# Altium footprint library chicken.PcbLib: 19 footprints (part 2 of 2)
Each footprint in its own frame and in the unit in brackets; x right, y up, seen from the top. Pads: shape width x height; smd on the part's side, far side on the other; paste and mask are expansions set on the pad; w line width, h text height; cw(c..) or ccw(c..) is an arc to the next point about the centre after c.
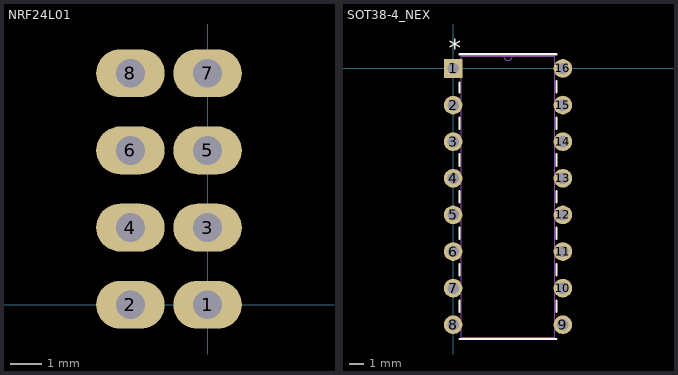
[diagram p1: the footprints below, top view; thin cyan lines are the x and y axes]

## NRF24L01 [mil]
pads (8):
  oval 86x60 hole 36: 1(0,0) 2(-96.85,0) 3(0,96.85) 4(-96.85,96.85) 5(0,193.7) 6(-96.85,193.7) 7(0,290.55) 8(-96.85,290.55)
3D body "NRF24l01_with_antenna.STEP": height 3757.81, standoff -127.56, extent -2823.39,-155 90,445.4

## PCBComponent_1 [mil]

## SOT38-4_NEX [mil]
pads (16):
  rect 51x51 hole 31 mask+0: 1(0,0)
  round 51 hole 31 mask+0: 2(0,-100) 3(0,-200) 4(0,-300) 5(0,-400) 6(0,-500) 7(0,-600) 8(0,-700) 9(300,-700) 10(300,-600) 11(300,-500) 12(300,-400) 13(300,-300) 14(300,-200) 15(300,-100) 16(300,0)
Top Overlay:
  lines w6: 17.5,-739 282.5,-739 ; 17.5,-665.59 17.5,-634.41 ; 17.5,-565.59 17.5,-534.41 ; 17.5,-465.59 17.5,-434.41 ; 17.5,-365.59 17.5,-334.41 ; 17.5,-265.59 17.5,-234.41 ; 17.5,-165.59 17.5,-134.41 ; 17.5,-65.59 17.5,-38.6 ; 17.5,39 282.5,39 ; 282.5,-665.59 282.5,-634.41 ; 282.5,-565.59 282.5,-534.41 ; 282.5,-465.59 282.5,-434.41 ; 282.5,-365.59 282.5,-334.41 ; 282.5,-265.59 282.5,-234.41 ; 282.5,-165.59 282.5,-134.41 ; 282.5,-65.59 282.5,-34.41
  text "*" at -12.5,30.5 h50
Mechanical 13:
  lines w0: 138,34 ccw(c150,34) 162,34
  lines w1: -15.5,-715.5 -15.5,-684.5 22.5,-684.5 22.5,-715.5 -15.5,-715.5 ; -15.5,-615.5 -15.5,-584.5 22.5,-584.5 22.5,-615.5 -15.5,-615.5 ; -15.5,-515.5 -15.5,-484.5 22.5,-484.5 22.5,-515.5 -15.5,-515.5 ; -15.5,-415.5 -15.5,-384.5 22.5,-384.5 22.5,-415.5 -15.5,-415.5 ; -15.5,-315.5 -15.5,-284.5 22.5,-284.5 22.5,-315.5 -15.5,-315.5 ; -15.5,-215.5 -15.5,-184.5 22.5,-184.5 22.5,-215.5 -15.5,-215.5 ; -15.5,-115.5 -15.5,-84.5 22.5,-84.5 22.5,-115.5 -15.5,-115.5 ; -15.5,-15.5 -15.5,15.5 22.5,15.5 22.5,-15.5 -15.5,-15.5 ; 22.5,-734 277.5,-734 277.5,34 22.5,34 22.5,-734 ; 277.5,-715.5 277.5,-684.5 315.5,-684.5 315.5,-715.5 277.5,-715.5 ; 277.5,-615.5 277.5,-584.5 315.5,-584.5 315.5,-615.5 277.5,-615.5 ; 277.5,-515.5 277.5,-484.5 315.5,-484.5 315.5,-515.5 277.5,-515.5 ; 277.5,-415.5 277.5,-384.5 315.5,-384.5 315.5,-415.5 277.5,-415.5 ; 277.5,-315.5 277.5,-284.5 315.5,-284.5 315.5,-315.5 277.5,-315.5 ; 277.5,-215.5 277.5,-184.5 315.5,-184.5 315.5,-215.5 277.5,-215.5 ; 277.5,-115.5 277.5,-84.5 315.5,-84.5 315.5,-115.5 277.5,-115.5 ; 277.5,-15.5 277.5,15.5 315.5,15.5 315.5,-15.5 277.5,-15.5
  text "*" at 20,-25 h50
3D body: height 10, standoff 0, extent 0,0 10,10
3D body: height 10, standoff 0, extent -4.99,-734.01 315,34.02